# Altium footprint library CONNs.PcbLib: 27 footprints (part 1 of 2)
Each footprint in its own frame and in the unit in brackets; x right, y up, seen from the top. Pads: shape width x height; smd on the part's side, far side on the other; paste and mask are expansions set on the pad; w line width, h text height; cw(c..) or ccw(c..) is an arc to the next point about the centre after c.
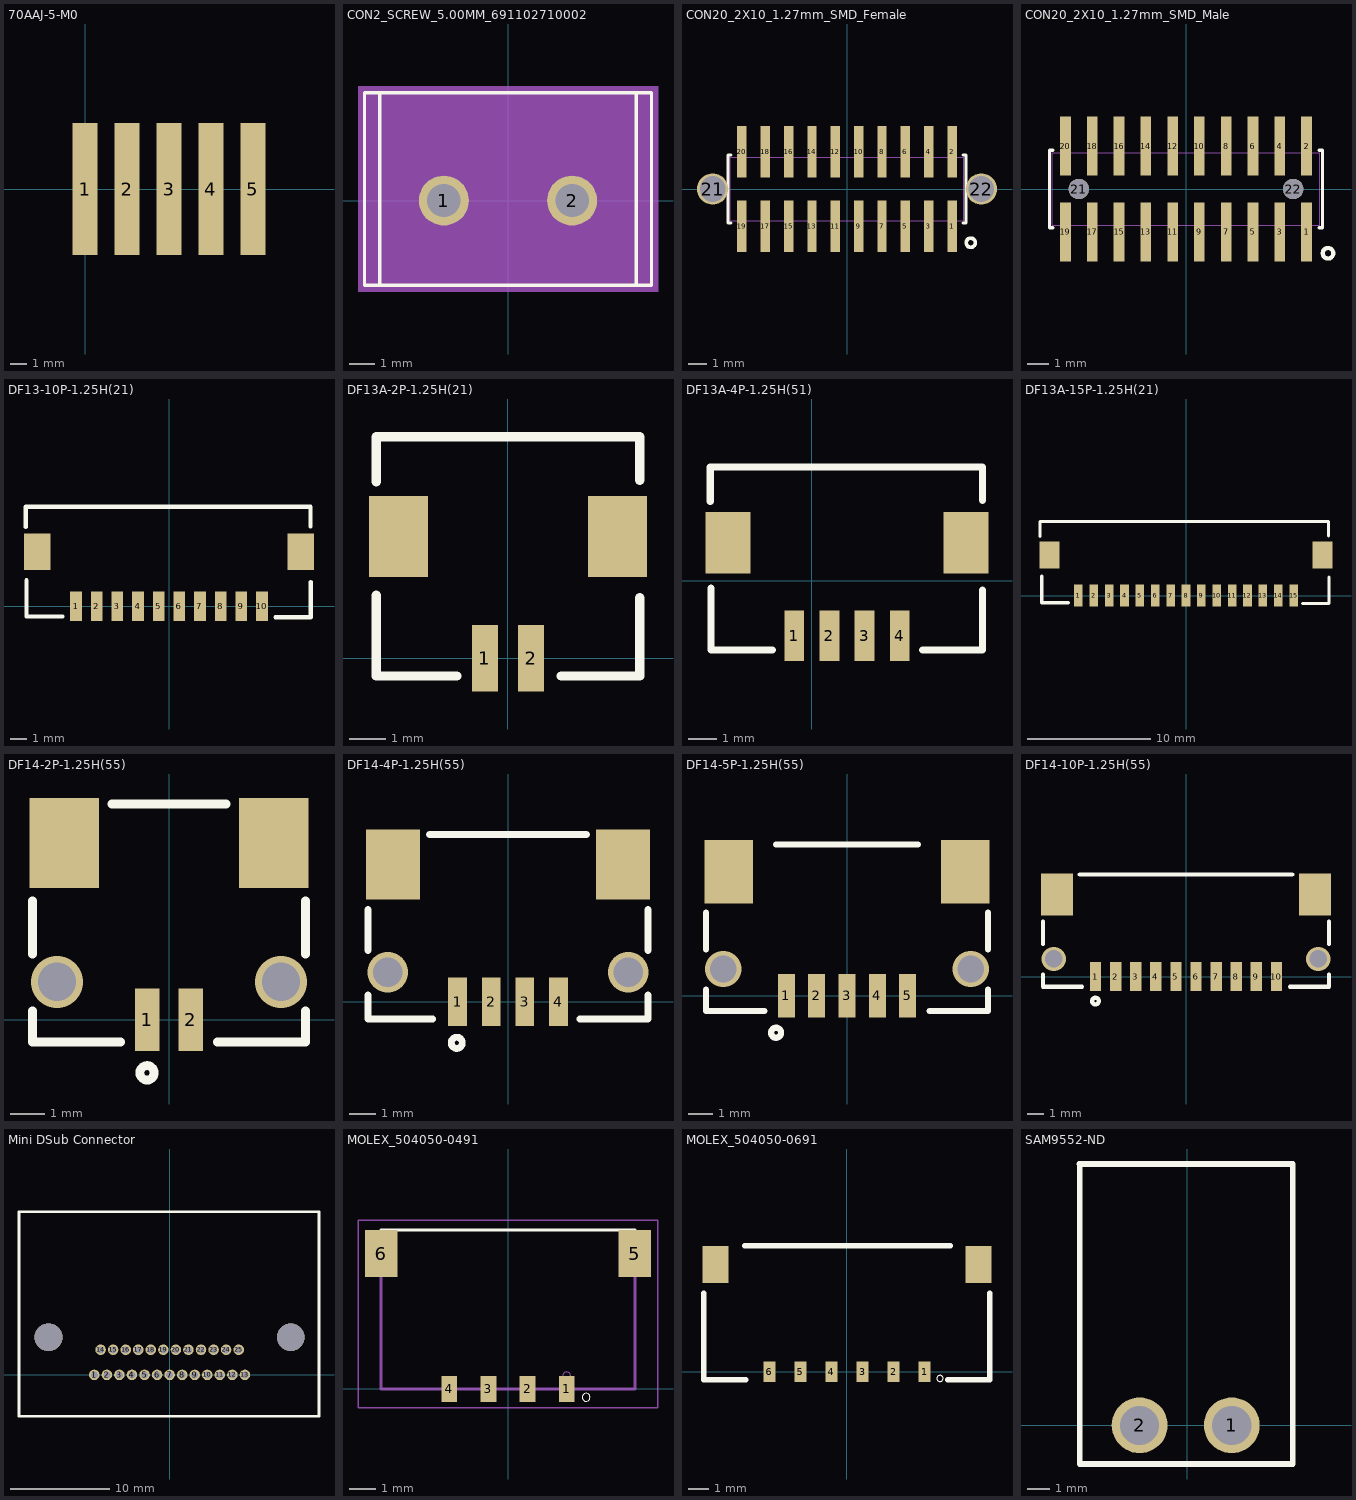
[diagram p0: the footprints below, top view; thin cyan lines are the x and y axes]

## 70AAJ-5-M0 [mm] "5 Pin Butterfly Connecter"
pads (5):
  rect 1.5x8 smd: 1(0,0) 2(2.54,0) 3(5.08,0) 4(7.62,0) 5(10.16,0)

## CON2_SCREW_5.00MM_691102710002 [mm] "2-Pos Screw terminal 5mm pitch"
height 9.9
pads (2):
  round 1.95 hole 1.3: 1(-2.5,0) 2(2.5,0)
Top Overlay:
  lines w0.127: -5,-3.3 -5,4.2 ; -5,-3.3 5,-3.3 ; -5,-3.3 -5.6,-3.3 -5.6,4.2 -5,4.2 ; -5,4.2 5,4.2 ; 5,-3.3 5,4.2 ; 5,-3.3 5.6,-3.3 5.6,4.2 5,4.2
Mechanical 4:
  text "1" at -3.65,-2.65 h1.88
  text "1" at -3.65,-2.65 h1.88
Mechanical 16:
  region: -5.85,4.45 5.85,4.45 5.85,-3.55 -5.85,-3.55
3D body: height 0.12, standoff -21.13, extent 0,0 0,0
3D body: height 0.12, standoff -21.13, extent -0.127,1.397 -0.127,1.397
3D body: height 0.12, standoff -21.13, extent 0,0 0,0
3D body: height 0.12, standoff -21.13, extent 5.08,6.604 5.08,6.604
3D body "Download_STP_691102710002 (rev1).stp": height 10.03, standoff -3.37, extent -5.981,-3.369 5.219,4.131
3D body: height 0.12, standoff -21.13, extent -0.762,-3.369 -0.762,-3.369

## CON20_2X10_1.27mm_SMD_Female [mil] "1.27mm pitch, 20 position female header. SAM9863-ND"
pads (22):
  rect 20x110 smd: 1(225,-80) 2(225,80) 3(175,-80) 4(175,80) 5(125,-80) 6(125,80) 7(75,-80) 8(75,80) 9(25,-80) 10(25,80) 11(-25,-80) 12(-25,80) 13(-75,-80) 14(-75,80) 15(-125,-80) 16(-125,80) 17(-175,-80) 18(-175,80) 19(-225,-80) 20(-225,80)
  round 66.93 / inner round 60 / far side round 38 hole 55.12: 21(-287.6,0) 22(287.6,0)
Top Overlay:
  circle w7.87: c265,-115 r9.84
  lines w6: -248.1,-72.5 -255,-72.5 -255,72.5 -248.1,72.5 ; 248.1,-72.5 255,-72.5 255,72.5 248.1,72.5
Mechanical 13:
  lines w1: -250,-67.5 -250,67.5 250,67.5 250,-67.5 -250,-67.5
3D body: height 10, standoff 0, extent 0,0 10,10
3D body "SAM9863-ND - 2X10 Female 50mil SMD v3.step": height 178.58, standoff -49.61, extent -310.03,-81.84 310.05,84.34

## CON20_2X10_1.27mm_SMD_Male [mil] "1.27mm pitch, 20 position female header. SAM11274-ND"
pads (22):
  rect 20x110 smd: 1(225,-80) 2(225,80) 3(175,-80) 4(175,80) 5(125,-80) 6(125,80) 7(75,-80) 8(75,80) 9(25,-80) 10(25,80) 11(-25,-80) 12(-25,80) 13(-75,-80) 14(-75,80) 15(-125,-80) 16(-125,80) 17(-175,-80) 18(-175,80) 19(-225,-80) 20(-225,80)
  round 38 / inner round 60 / far side round 38 hole 38: 21(-200,0) 22(200,0)
Top Overlay:
  circle w7.87: c265,-120 r9.84
  lines w6: -248.1,-72.5 -255,-72.5 -255,72.5 -248.1,72.5 ; 248.1,-72.5 255,-72.5 255,72.5 248.1,72.5
Mechanical 13:
  lines w1: -250,-67.5 -250,67.5 250,67.5 250,-67.5 -250,-67.5
3D body "SAM11274-ND - 2X10 Male 50mil SMD v1.step": height 264.62, standoff -0.38, extent -249.02,-116.14 250.99,113.86

## DF13-10P-1.25H(21) [mm] "10 pos, 1.25mm pitch DF13 connector (H125973CT-ND)"
height 3.6
pads (12):
  rect 0.7x1.8 smd: 1(-5.625,0) 2(-4.375,0) 3(-3.125,0) 4(-1.875,0) 5(-0.625,0) 6(0.625,0) 7(1.875,0) 8(3.125,0) 9(4.375,0) 10(5.625,0)
  rect 1.6x2.2 smd: ""(-7.975,3.3) ""(7.975,3.3)
Top Overlay:
  lines w0.254: -8.661,4.794 -8.661,6.017 8.553,6.017 8.553,4.832 ; -8.63,1.581 -8.63,-0.61 -6.452,-0.61 ; 6.452,-0.66 8.579,-0.66 8.579,1.467
3D body "DF13-10S-1.25C.stp": height 3.46, standoff 0.26, extent -7.057,2.68 7.093,6.68
3D body "DF13A-10P-1.25H.stp": height 3.58, standoff -0.02, extent -8.55,-0.582 8.6,5.918

## DF13A-2P-1.25H(21) [mm] "2 pos, 1.25mm pitch DF13 connector (H125743CT-ND)"
height 3.6
pads (4):
  rect 0.7x1.8 smd: 1(-0.625,0) 2(0.625,0)
  rect 1.6x2.2 smd: ""(-2.975,3.3) ""(2.975,3.3)
Top Overlay:
  lines w0.254: -3.575,1.708 -3.575,-0.483 -1.397,-0.483 ; -3.575,4.794 -3.575,6.017 3.575,6.017 3.575,4.832 ; 1.448,-0.483 3.575,-0.483 3.575,1.645
3D body "DF13-2S-1.25C.stp": height 3.46, standoff 0.26, extent -2.05,2.794 2.1,6.794
3D body "DF13A-2P-1.25H.stp": height 3.58, standoff -0.02, extent -3.575,-0.483 3.575,6.017

## DF13A-4P-1.25H(51) [mm] "4 pos, 1.25mm pitch DF13 connector (H125779CT-ND)"
height 3.6
pads (6):
  rect 0.7x1.8 smd: 1(-0.625,-1.956) 2(0.625,-1.956) 3(1.875,-1.956) 4(3.125,-1.956)
  rect 1.6x2.2 smd: ""(-2.975,1.344) ""(5.475,1.344)
Top Overlay:
  lines w0.254: -3.607,2.813 -3.607,4.036 6.064,4.036 6.064,2.851 ; -3.581,-0.273 -3.581,-2.464 -1.403,-2.464 ; 3.937,-2.464 6.064,-2.464 6.064,-0.337
3D body "DF13-4S-1.25C.stp": height 3.46, standoff 0.26, extent -2.071,0.75 4.579,4.75
3D body "DF13A-4P-1.25H.stp": height 3.58, standoff -0.02, extent -3.606,-2.461 6.044,4.039

## DF13A-15P-1.25H(21) [mm] "15 pos, 1.25mm pitch DF13 connector (H125988CT-ND)"
height 3.6
pads (17):
  rect 0.7x1.8 smd: 1(-8.75,0) 2(-7.5,0) 3(-6.25,0) 4(-5,0) 5(-3.75,0) 6(-2.5,0) 7(-1.25,0) 8(0,0) 9(1.25,0) 10(2.5,0) 11(3.75,0) 12(5,0) 13(6.25,0) 14(7.5,0) 15(8.75,0)
  rect 1.6x2.2 smd: ""(-11.1,3.3) ""(11.1,3.3)
Top Overlay:
  lines w0.254: -11.862,4.82 -11.862,6.043 11.601,6.043 11.601,4.858 ; -11.728,1.607 -11.728,-0.584 -9.55,-0.584 ; 9.5,-0.635 11.627,-0.635 11.627,1.492
3D body "DF13-15S-1.25C.stp": height 3.46, standoff 0.26, extent -10.175,2.756 10.225,6.756
3D body "DF13A-15P-1.25H.stp": height 3.58, standoff -0.02, extent -11.703,-0.505 11.697,5.996

## DF14-2P-1.25H(55) [mm]
height 2.5
pads (4):
  rect 0.7x1.8 smd: 1(-0.625,0) 2(0.625,0)
  rect 2x2.6 smd: ""(-3.025,5.1) ""(3.025,5.1)
via -3.225,1.1 diameter 1.5 hole 1.1
via 3.225,1.1 diameter 1.5 hole 1.1
Top Overlay:
  circle w0.254: c-0.635,-1.524 r0.207
  lines w0.254: -3.937,0.254 -3.937,-0.635 -1.397,-0.635 ; -3.937,1.905 -3.937,3.429 ; -1.651,6.223 -0.826,6.223 0.826,6.223 1.651,6.223 ; 1.397,-0.635 3.937,-0.635 3.937,0.254 ; 3.937,1.905 3.937,3.429
3D body "DF14A-2P-1.25H v1.step": height 2.5, standoff 0, extent -3.725,-0.475 3.725,6.225

## DF14-4P-1.25H(55) [mm]
height 2.5
pads (6):
  rect 0.7x1.8 smd: 1(-1.875,0) 2(-0.625,0) 3(0.625,0) 4(1.875,0)
  rect 2x2.6 smd: ""(-4.275,5.1) ""(4.275,5.1)
via 4.475,1.1 diameter 1.5 hole 1.1
via -4.475,1.1 diameter 1.5 hole 1.1
Top Overlay:
  circle w0.254: c-1.905,-1.524 r0.207
  lines w0.254: -5.207,0.254 -5.207,-0.635 -2.794,-0.635 ; -5.207,1.905 -5.207,3.429 ; -2.921,6.223 2.921,6.223 ; 2.667,-0.635 5.207,-0.635 5.207,0.254 ; 5.207,1.905 5.207,3.429
3D body "DF14-4P-1.25H v2.step": height 2.5, standoff -0.4, extent -4.95,-0.475 5,6.225

## DF14-5P-1.25H(55) [mm]
height 2.5
pads (7):
  rect 0.7x1.8 smd: 1(-2.5,0) 2(-1.25,0) 3(0,0) 4(1.25,0) 5(2.5,0)
  rect 2x2.6 smd: ""(-4.875,5.1) ""(4.875,5.1)
via 5.1,1.1 diameter 1.5 hole 1.1
via -5.1,1.1 diameter 1.5 hole 1.1
Top Overlay:
  circle w0.254: c-2.921,-1.524 r0.207
  lines w0.254: -5.807,0.254 -5.807,-0.635 -3.394,-0.635 ; -5.807,1.905 -5.807,3.429 ; -2.921,6.223 2.921,6.223 ; 3.394,-0.635 5.807,-0.635 5.807,0.254 ; 5.807,1.905 5.807,3.429
3D body "DF14-5P-1.25H v1.step": height 2.3, standoff -0.8, extent -5.6,-0.5 5.6,6.2

## DF14-10P-1.25H(55) [mm]
height 2.5
pads (12):
  rect 0.7x1.8 smd: 1(-5.625,0) 2(-4.375,0) 3(-3.125,0) 4(-1.875,0) 5(-0.625,0) 6(0.625,0) 7(1.875,0) 8(3.125,0) 9(4.375,0) 10(5.625,0)
  rect 2x2.6 smd: ""(-8.025,5.1) ""(8.025,5.1)
via -8.225,1.1 diameter 1.5 hole 1.1
via 8.225,1.1 diameter 1.5 hole 1.1
Top Overlay:
  circle w0.254: c-5.625,-1.524 r0.207
  lines w0.254: -8.89,0.127 -8.89,-0.635 -6.477,-0.635 ; -8.89,2.032 -8.89,3.429 ; -6.604,6.35 6.604,6.35 ; 6.477,-0.635 8.89,-0.635 8.89,0.127 8.89,0 8.89,-0.381 ; 8.89,2.032 8.89,3.429
3D body "DF14A-10P-1.25H v2.step": height 2.49, standoff -0.01, extent -8.725,-0.5 8.725,6.2

## Mini DSub Connector [mil]
pads (25):
  round 42 hole 28: 1(-300,0) 2(-250,0) 3(-200,0) 4(-150,0) 5(-100,0) 6(-50,0) 7(0,0) 8(50,0) 9(100,0) 10(150,0) 11(200,0) 12(250,0) 13(300,0) 14(-275,100) 15(-225,100) 16(-175,100) 17(-125,100) 18(-75,100) 19(-25,100) 20(25,100) 21(75,100) 22(125,100) 23(175,100) 24(225,100) 25(275,100)
via 482.5,150 diameter 110 hole 110
via -482.5,150 diameter 110 hole 110
Top Overlay:
  lines w10: -600,-165 -600,650 595,650 595,-165 -600,-165
3D body: height 10, standoff 0, extent -9.84,246.06 -9.84,246.06
3D body "[MiniD] 836149012 v1.step": height 356.91, standoff -60.09, extent -594,-37.67 588.34,623.33

## MOLEX_504050-0491 [mm]
pads (6):
  rect 0.6x1 smd: 1(2.25,0) 2(0.75,0) 3(-0.75,0) 4(-2.25,0)
  rect 1.25x1.8 smd: 5(4.855,5.19) 6(-4.855,5.19)
Top Overlay:
  circle w0: c2.997,-0.32 r0.15
  lines w0.127: -4.875,6.1 4.875,6.1
Mechanical 4:
  circle w0: c2.25,0.5 r0.15
  circle w0: c2.25,0.5 r0.15
  lines w0.127: -4.875,0 -4.875,6.1 -4.875,0 ; -4.875,0 4.875,0 ; -4.875,0 4.875,0 ; 4.875,0 4.875,6.1 4.875,0
Mechanical 16:
  lines w0.05: -5.75,-0.725 -5.75,6.475 5.75,6.475 5.75,-0.725 -5.75,-0.725
3D body "504050-0491--3DModel-STEP-1.STEP": height 2.15, standoff 0, extent -5.275,-0.34 5.275,6.1

## MOLEX_504050-0691 [mm] "Molex connector to antenna"
height 2
pads (8):
  rect 0.6x1 smd: 1(3.762,0) 2(2.262,0) 3(0.762,0) 4(-0.738,0) 5(-2.238,0) 6(-3.738,0)
  rect 1.25x1.8 smd: ""(-6.343,5.19) ""(6.367,5.19)
Top Overlay:
  circle w0: c4.509,-0.32 r0.15
  lines w0.254: -6.921,3.81 -6.921,-0.381 -4.889,-0.381 ; -4.946,6.096 5.017,6.096 ; 4.89,-0.381 6.922,-0.381 6.922,3.81
3D body "MOLEX504050-0691.stp": height 0.98, standoff -1.02, extent -6.775,-0.414 6.775,6.026

## SAM9552-ND [mil] "Samtec Connector Through Hole, Right Angle 2 pos 0.165\" (4.20mm) pitch"
height 259.06
pads (2):
  round 100 hole 70 mask+3: 1(80,0) 2(-85,0)
Top Overlay:
  lines w10: -193.25,468 189.25,468 189.25,-69.25 -192.5,-69.25 -192.5,465.5
3D body "IPBT-102-H1-T-S-RA.stp": height 286.03, standoff -146.97, extent -193.25,-19.5 189.25,468
3D body "IPBD-02-S-K.stp": height 386.03, standoff -26.97, extent -247,183 243,953